# Altium footprint library Gen_Devices.pcblib: 211 footprints (part 7 of 14)
Each footprint in its own frame and in the unit in brackets; x right, y up, seen from the top. Pads: shape width x height; smd on the part's side, far side on the other; paste and mask are expansions set on the pad; w line width, h text height; cw(c..) or ccw(c..) is an arc to the next point about the centre after c.
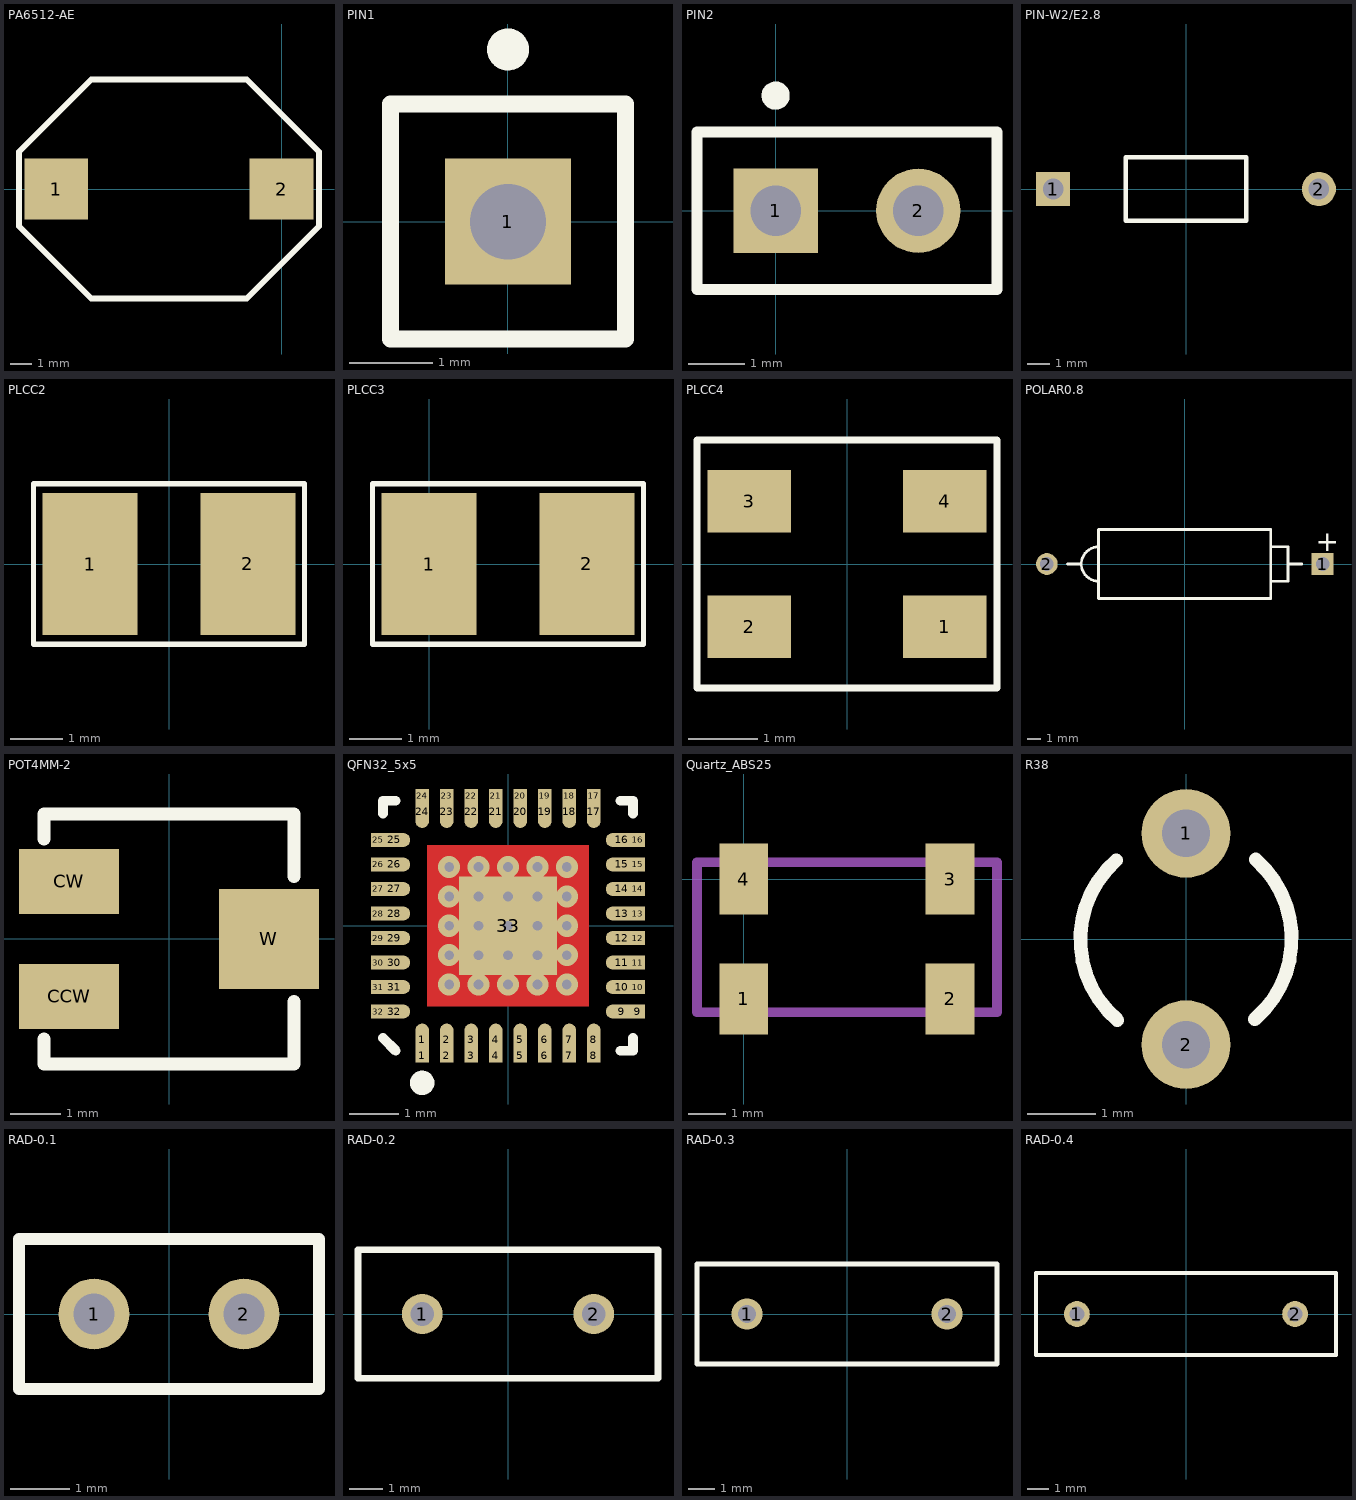
[diagram p6: the footprints below, top view; thin cyan lines are the x and y axes]

## PA6512-AE [mm] "RFID antenna"
pads (2):
  rect 2.92x2.79 smd: 1(-10.3,0) 2(-0.01,0)
Top Overlay:
  lines w0.254: -12,-1.7 -12,1.7 -8.7,5 -1.6,5 1.7,1.7 1.7,-1.7 -1.6,-5 -8.7,-5 -12,-1.7
3D body "Coilcraft-PA6512-AE.step": height 5.16, standoff -0.05, extent -11.386,-4.7 0.987,4.7

## PIN1 [mm] "Generic Antenna; 1 Lead"
pads (1):
  rect 1.5x1.5 hole 0.9: 1(0,0)
Top Overlay:
  circle w0.25: c0,2.05 r0.125
  lines w0.2: -1.4,-1.4 -1.4,1.4 1.4,1.4 1.4,-1.4 -1.4,-1.4

## PIN2 [mm] "Photosensitive Diode; 2 Leads"
pads (2):
  rect 1.5x1.5 hole 0.9: 1(0,0)
  round 1.5 hole 0.9: 2(2.54,0)
Top Overlay:
  circle w0.25: c0,2.05 r0.125
  lines w0.2: -1.4,-1.4 3.94,-1.4 3.94,1.4 -1.4,1.4 -1.4,-1.4

## PIN-W2/E2.8 [mm] "Thru-Hole; 2 Leads"
pads (2):
  rect 1.5x1.5 hole 0.9: 1(-5.825,0)
  round 1.5 hole 0.9: 2(5.825,0)
Top Overlay:
  lines w0.2: -2.65,-1.4 2.65,-1.4 2.65,1.4 -2.65,1.4 -2.65,-1.4

## PLCC2 [mm] "Chip Resistor, Body 2.0x1.2mm, IPC Medium Density"
height 0.7
pads (2):
  rect 1.8x2.7 smd: 1(-1.5,0) 2(1.5,0)
Top Overlay:
  lines w0.1: -2.575,-1.525 -2.575,1.525 2.575,1.525 2.575,-1.525 -2.575,-1.525
3D body "PLCC-2_VSMY3850.STEP": height 1.7, standoff 0.05, extent -1.725,-1.4 1.775,1.4

## PLCC3 [mm] "Chip Resistor, Body 2.0x1.2mm, IPC Medium Density"
height 0.7
pads (2):
  rect 1.8x2.7 smd: 1(0,0) 2(3,0)
Top Overlay:
  lines w0.1: -1.075,-1.525 4.075,-1.525 4.075,1.525 -1.075,1.525 -1.075,-1.525

## PLCC4 [mm] "Chip Resistor, Body 2.0x1.2mm, IPC Medium Density"
height 0.7
pads (4):
  rect 1.2x0.9 smd: 1(1.4,-0.9) 2(-1.4,-0.9) 3(-1.4,0.9) 4(1.4,0.9)
Top Overlay:
  lines w0.1: -2.15,-1.775 2.15,-1.775 2.15,1.775 -2.15,1.775 -2.15,-1.775
3D body "PLCC-4.STEP": height 2, standoff 0, extent -1.8,-1.7 1.8,1.7

## POLAR0.8 [mm] "Polarized Capacitor; 2 Leads"
height 5.08
pads (2):
  rect 1.6x1.6 hole 1: 1(10.16,0)
  round 1.6 hole 1: 2(-10.16,0)
Top Overlay:
  lines w0.2: -8.636,0 -7.62,0 ; -6.35,-1.27 cw(c-6.35,0) -6.35,1.27 ; 6.35,-1.27 7.62,-1.27 7.62,1.27 6.35,1.27 ; 7.62,0 8.636,0 ; -6.35,-2.54 6.35,-2.54 6.35,2.54 -6.35,2.54 -6.35,-2.54
  text "+" at 9.652,0.95 h1.5

## POT4MM-2 [mm] "Square Trimming Potentiometer"
pads (3):
  rect 2x1.3 smd: CCW(-2,-1.15) CW(-2,1.15)
  rect 2x2 smd: W(2,0)
Top Overlay:
  lines w0.254: -2.5,-2 -2.5,-2.5 2.5,-2.5 2.5,-1.25 ; -2.5,2 -2.5,2.5 2.5,2.5 2.5,1.25

## QFN32_5x5 [mm]
pads (65):
  rect 0.28x0.28 smd: 1(-1.75,-2.65) 2(-1.25,-2.65) 3(-0.75,-2.65) 4(-0.25,-2.65) 5(0.25,-2.65) 6(0.75,-2.65) 7(1.25,-2.65) 8(1.75,-2.65) 9(2.65,-1.75) 10(2.65,-1.25) 11(2.65,-0.75) 12(2.65,-0.25) 13(2.65,0.25) 14(2.65,0.75) 15(2.65,1.25) 16(2.65,1.75) 17(1.75,2.65) 18(1.25,2.65) 19(0.75,2.65) 20(0.25,2.65) 21(-0.25,2.65) 22(-0.75,2.65) 23(-1.25,2.65) 24(-1.75,2.65) 25(-2.65,1.75) 26(-2.65,1.25) 27(-2.65,0.75) 28(-2.65,0.25) 29(-2.65,-0.25) 30(-2.65,-0.75) 31(-2.65,-1.25) 32(-2.65,-1.75)
  oval 0.28x0.66 smd: 1(-1.75,-2.325) 2(-1.25,-2.325) 3(-0.75,-2.325) 4(-0.25,-2.325) 5(0.25,-2.325) 6(0.75,-2.325) 7(1.25,-2.325) 8(1.75,-2.325) 17(1.75,2.325) 18(1.25,2.325) 19(0.75,2.325) 20(0.25,2.325) 21(-0.25,2.325) 22(-0.75,2.325) 23(-1.25,2.325) 24(-1.75,2.325)
  oval 0.66x0.28 smd: 9(2.325,-1.75) 10(2.325,-1.25) 11(2.325,-0.75) 12(2.325,-0.25) 13(2.325,0.25) 14(2.325,0.75) 15(2.325,1.25) 16(2.325,1.75) 25(-2.325,1.75) 26(-2.325,1.25) 27(-2.325,0.75) 28(-2.325,0.25) 29(-2.325,-0.25) 30(-2.325,-0.75) 31(-2.325,-1.25) 32(-2.325,-1.75)
  rect 2x2 smd paste+0.6: 33(0,0)
via 1.2,0 diameter 0.45 hole 0.2
via 0.6,0 diameter 0.45 hole 0.2
via -0.6,0 diameter 0.45 hole 0.2
via 0,0 diameter 0.45 hole 0.2
via -1.2,0 diameter 0.45 hole 0.2
via 1.2,-1.2 diameter 0.45 hole 0.2
via 0.6,-1.2 diameter 0.45 hole 0.2
via -0.6,-1.2 diameter 0.45 hole 0.2
via 0,-1.2 diameter 0.45 hole 0.2
via -1.2,-1.2 diameter 0.45 hole 0.2
via -1.2,-0.6 diameter 0.45 hole 0.2
via 0,-0.6 diameter 0.45 hole 0.2
via -0.6,-0.6 diameter 0.45 hole 0.2
via 0.6,-0.6 diameter 0.45 hole 0.2
via 1.2,-0.6 diameter 0.45 hole 0.2
via -1.2,0.6 diameter 0.45 hole 0.2
via 0,0.6 diameter 0.45 hole 0.2
via -0.6,0.6 diameter 0.45 hole 0.2
via 0.6,0.6 diameter 0.45 hole 0.2
via 1.2,0.6 diameter 0.45 hole 0.2
via 1.2,1.2 diameter 0.45 hole 0.2
via 0.6,1.2 diameter 0.45 hole 0.2
via -0.6,1.2 diameter 0.45 hole 0.2
via 0,1.2 diameter 0.45 hole 0.2
via -1.2,1.2 diameter 0.45 hole 0.2
Top Layer:
  rectangle: -1.65,-1.65 1.65,1.65
Top Overlay:
  circle w0.25: c-1.75,-3.205 r0.125
  lines w0.2: -2.55,-2.29 -2.29,-2.55 ; -2.55,2.29 -2.55,2.55 -2.29,2.55 ; 2.29,-2.55 2.55,-2.55 2.55,-2.29 ; 2.29,2.55 2.55,2.55 2.55,2.29
3D body "QFN32-5x5.step": height 0.8, standoff 0, extent -2.51,-2.51 2.51,2.51

## Quartz_ABS25 [mm]
pads (4):
  rect 1.3x1.9 smd: 1(0,-3.2) 2(5.5,-3.2) 3(5.5,0) 4(0,0)
Mechanical 1:
  lines w0.254: -1.25,-3.55 6.75,-3.55 6.75,0.45 -1.25,0.45 -1.25,-3.55
3D body "Quartz_ABS25.step": height 2.7, standoff -0.01, extent -1.25,-3.55 6.75,0.45

## R38 [mm] "Crystal, Thru-Hole; 2 Leads; Body 3.1 x 8.2 mm (Dia.xH)"
height 8.2
pads (2):
  round 1.3 hole 0.7: 1(0,1.55) 2(0,-1.55)
Top Overlay:
  lines w0.2: -1.022,1.155 ccw(c0,-0.01) -1.006,-1.189 ; 1.006,-1.179 ccw(c0,0) 1.022,1.165

## RAD-0.1 [mm] "Radial Cap, Thru-Hole; 2 Leads; 0.1 in Pin Spacing"
pads (2):
  round 1.2 hole 0.7: 1(-1.27,0) 2(1.27,0)
Top Overlay:
  lines w0.2: -2.54,-1.27 -2.54,1.27 2.54,1.27 2.54,-1.27 -2.54,-1.27
3D body "10pF Ceramic Disc 2.STEP": height 7.35, standoff -6.68, extent -2.35,-1.3 2.35,1.2

## RAD-0.2 [mm] "Radial Cap, Thru-Hole; 2 Leads; 0.2 in Pin Spacing"
pads (2):
  round 1.2 hole 0.7: 1(-2.54,0) 2(2.54,0)
Top Overlay:
  lines w0.2: -4.445,-1.905 -4.445,1.905 4.445,1.905 4.445,-1.905 -4.445,-1.905

## RAD-0.3 [mm] "Radial Cap, Thru-Hole; 2 Leads; 0.3 in Pin Spacing"
height 6
pads (2):
  round 1.2 hole 0.7: 1(-3.81,0) 2(3.81,0)
Top Overlay:
  lines w0.2: -5.715,-1.905 -5.715,1.905 5.715,1.905 5.715,-1.905 -5.715,-1.905

## RAD-0.4 [mm] "Radial Cap, Thru-Hole; 2 Leads; 0.4 in Pin Spacing"
pads (2):
  round 1.2 hole 0.7: 1(-5.08,0) 2(5.08,0)
Top Overlay:
  lines w0.2: -6.985,-1.905 6.985,-1.905 6.985,1.905 -6.985,1.905 -6.985,-1.905